# Altium footprint library General.PCBLIB: 231 footprints (part 4 of 15)
Each footprint in its own frame and in the unit in brackets; x right, y up, seen from the top. Pads: shape width x height; smd on the part's side, far side on the other; paste and mask are expansions set on the pad; w line width, h text height; cw(c..) or ccw(c..) is an arc to the next point about the centre after c.
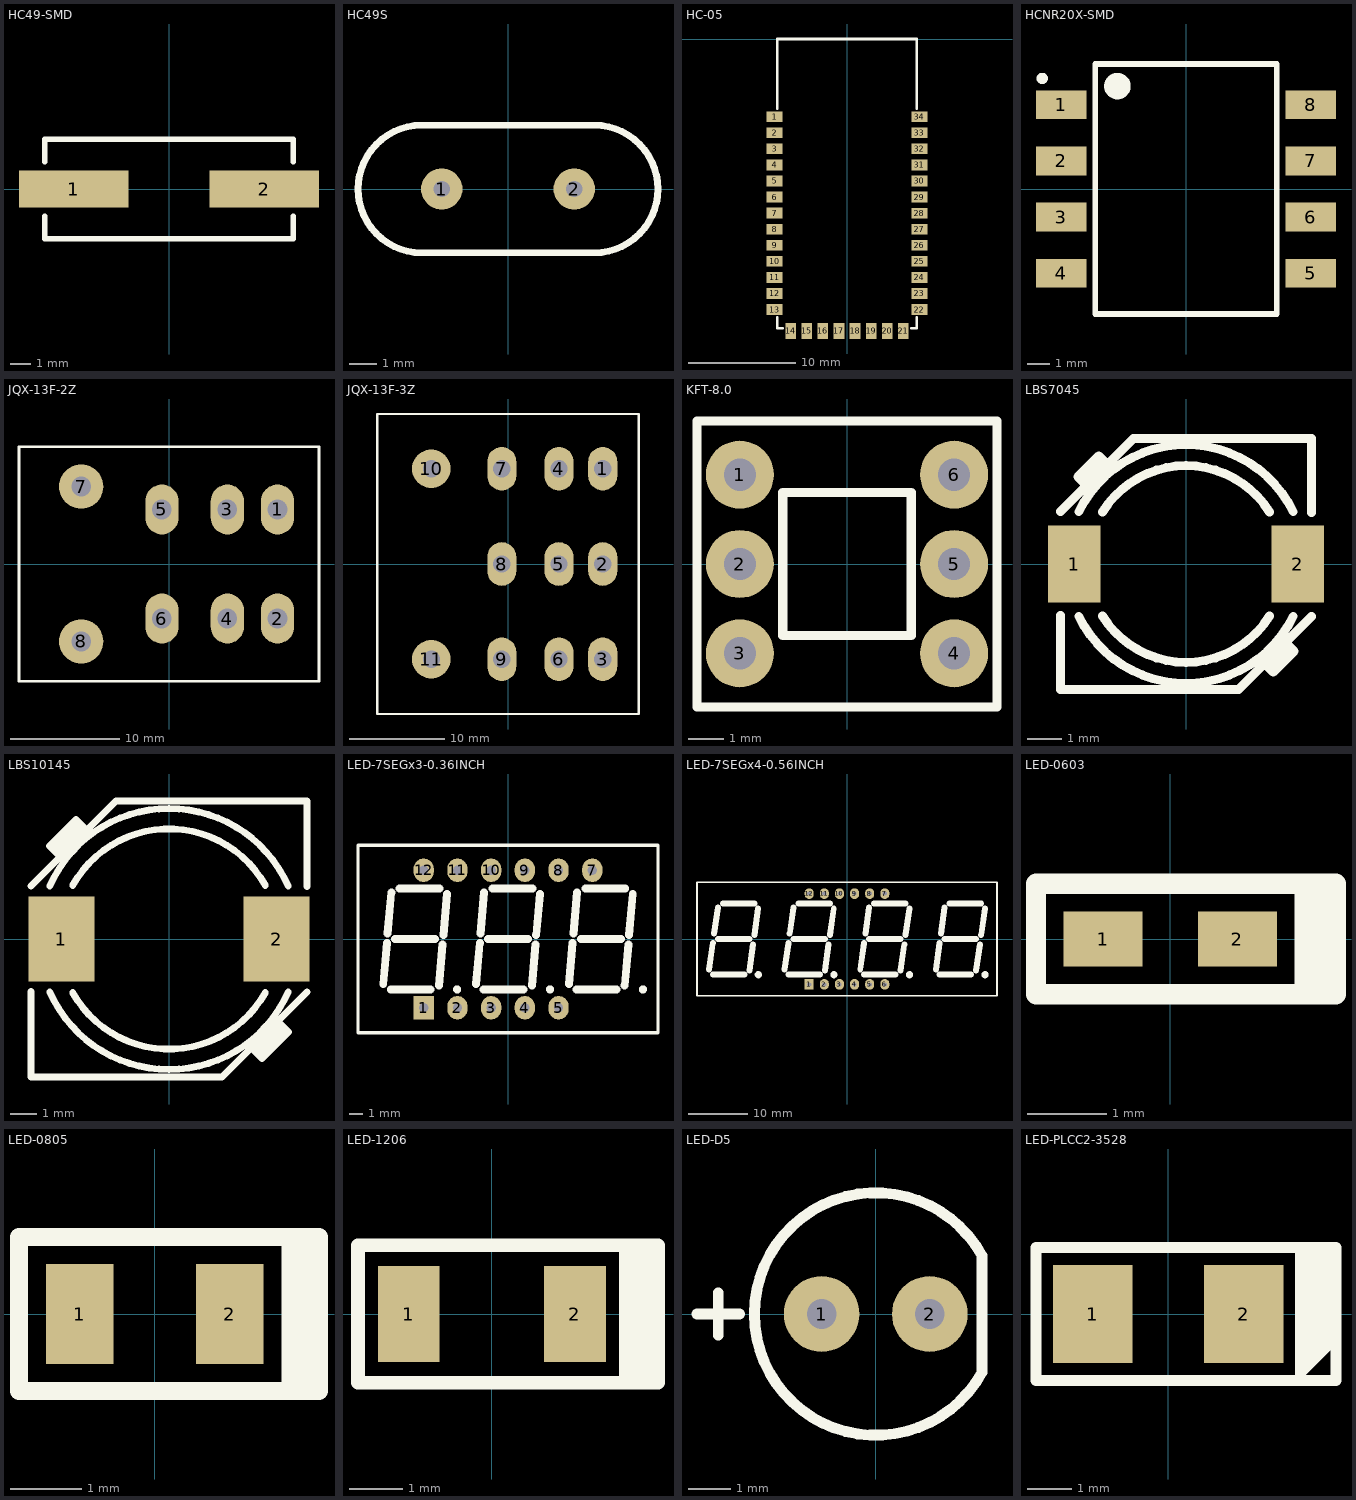
[diagram p3: the footprints below, top view; thin cyan lines are the x and y axes]

## HC49-SMD [mm] "CRYSTAL, SMD"
height 5.08
pads (2):
  rect 5.3x1.8 smd: 1(-4.6,0) 2(4.6,0)
Top Overlay:
  lines w0.254: -6,-1.3 -6,-2.4 6,-2.4 6,-1.3 ; -6,1.3 -6,2.4 6,2.4 6,1.3
3D body "HC49US.STEP": height 4.2, standoff 0, extent -6.35,-2.35 6.35,2.35

## HC49S [mm] "CRYSTAL"
height 4.2
pads (2):
  round 1.524 hole 0.6: 1(-2.44,0) 2(2.44,0)
Top Overlay:
  lines w0.254: -3.175,-2.35 cw(c-3.175,0) -3.175,2.35 3.175,2.35 cw(c3.175,0) 3.175,-2.35 -3.175,-2.35
3D body "HC49S.STEP": height 3.6, standoff -3, extent -5.49,-2.245 5.49,2.246

## HC-05 [mm] "Bluetooth Module, HC-05"
height 2
pads (34):
  rect 1.5x1 smd: 1(-6.75,-7.25) 2(-6.75,-8.75) 3(-6.75,-10.25) 4(-6.75,-11.75) 5(-6.75,-13.25) 6(-6.75,-14.75) 7(-6.75,-16.25) 8(-6.75,-17.75) 9(-6.75,-19.25) 10(-6.75,-20.75) 11(-6.75,-22.25) 12(-6.75,-23.75) 13(-6.75,-25.25) 22(6.75,-25.25) 23(6.75,-23.75) 24(6.75,-22.25) 25(6.75,-20.75) 26(6.75,-19.25) 27(6.75,-17.75) 28(6.75,-16.25) 29(6.75,-14.75) 30(6.75,-13.25) 31(6.75,-11.75) 32(6.75,-10.25) 33(6.75,-8.75) 34(6.75,-7.25)
  rect 1x1.5 smd: 14(-5.25,-27.25) 15(-3.75,-27.25) 16(-2.25,-27.25) 17(-0.75,-27.25) 18(0.75,-27.25) 19(2.25,-27.25) 20(3.75,-27.25) 21(5.25,-27.25)
Top Overlay:
  lines w0.254: -6.5,-26 -6.5,-27 -6,-27 ; -6.5,-6.5 -6.5,0 6.5,0 6.5,-6.5 ; 6,-27 6.5,-27 6.5,-26
3D body: height 2, standoff 0, extent -6.5,-27 6.5,0

## HCNR20X-SMD [mm] "HCNR20X 8 PIN Gull Wing Surface Mount Option #300"
height 5
pads (8):
  rect 2.29x1.3 smd: 1(-5.635,3.81) 2(-5.635,1.27) 3(-5.635,-1.27) 4(-5.635,-3.81) 5(5.635,-3.81) 6(5.635,-1.27) 7(5.635,1.27) 8(5.635,3.81)
Top Overlay:
  circle w0.254: c-6.5,5 r0.127
  circle w0.6: c-3.1,4.65 r0.3
  lines w0.254: -4.1,-5.65 4.1,-5.65 4.1,5.65 -4.1,5.65 -4.1,-5.65
3D body "HCNR200-SMD.STEP": height 4.75, standoff 0, extent -6.15,-5.575 6.15,5.575

## JQX-13F-2Z [mm] "Relay"
height 35
pads (8):
  oval 3.048x4.572 hole 1.8: 1(9.95,5) 2(9.95,-5) 3(5.35,5) 4(5.35,-5) 5(-0.65,5) 6(-0.65,-5)
  round 4.064 hole 1.8: 7(-8.05,7.1) 8(-8.05,-7.1)
Top Overlay:
  lines w0.254: -13.75,-10.75 -13.75,10.75 13.75,10.75 13.75,-10.75 -13.75,-10.75
3D body "LY2.STEP": height 35.3, standoff -6.4, extent -14,-10.75 14,10.75

## JQX-13F-3Z [mm] "Relay"
height 35
pads (11):
  oval 3.048x4.572 hole 1.8: 1(9.95,10) 2(9.95,0) 3(9.95,-10) 4(5.35,10) 5(5.35,0) 6(5.35,-10) 7(-0.65,10) 8(-0.65,0) 9(-0.65,-10)
  round 4.064 hole 1.8: 10(-8.05,10) 11(-8.05,-10)
Top Overlay:
  lines w0.254: -13.75,-15.75 13.75,-15.75 13.75,15.75 -13.75,15.75 -13.75,-15.75
3D body: height 35, standoff 0, extent -13.75,-15.75 13.75,15.75

## KFT-8.0 [mm] "PUSH SWITCH"
height 13
pads (6):
  round 1.905 hole 0.9: 1(-3,2.5) 2(-3,0) 3(-3,-2.5) 4(3,-2.5) 5(3,0) 6(3,2.5)
Top Overlay:
  lines w0.254: -4.2,-4 -4.2,4 4.2,4 4.2,-4 -4.2,-4 ; -1.8,-2 -1.8,2 1.8,2 1.8,-2 -1.8,-2
3D body "KFT-8.0.STEP": height 13.5, standoff -3.5, extent -4,-4.2 4,4

## LBS7045 [mm] "FENGHUA, Inductor, SMD, LBS7045"
height 4.5
pads (2):
  rect 1.5x2.2 smd: 1(-3.2,0) 2(3.2,0)
Top Overlay:
  lines w0.254: -3.6,-1.48 -3.6,-3.6 1.5,-3.6 3.6,-1.5 ; -3.6,1.5 -1.5,3.6 3.6,3.6 3.6,1.48 ; -3.074,-1.499 ccw(c0,0) 3.074,-1.499 ; -3.074,1.499 cw(c0,0) 3.074,1.499 ; -3,2.4 -2.4,3 ; -2.8,2.2 -3.1,2.5 -2.5,3.1 -2.2,2.8 ; -2.391,-1.494 ccw(c0,0) 2.391,-1.494 ; -2.391,1.494 cw(c0,0) 2.391,1.494 ; 2.2,-2.8 2.5,-3.1 3.1,-2.5 2.8,-2.2 ; 2.4,-3 3,-2.4
3D body "SUMIDA-CDRR75.STEP": height 4.5, standoff -0.03, extent -3.525,-3.5 3.525,3.5

## LBS10145 [mm] "FENGHUA, Inductor, SMD, LBS10145"
height 4.5
pads (2):
  rect 2.5x3.2 smd: 1(-4.05,0) 2(4.05,0)
Top Overlay:
  lines w0.254: -5.2,-1.98 -5.2,-5.2 2,-5.2 5.2,-2 ; -5.2,2 -2,5.2 5.2,5.2 5.2,1.98 ; -4.49,-1.999 ccw(c0,0) 4.49,-1.999 ; -4.49,1.999 cw(c0,0) 4.49,1.999 ; -4.4,3.4 -3.4,4.4 ; -4.3,3.3 -3.3,4.3 ; -4.2,3.2 -3.2,4.2 ; -4,3 -4.5,3.5 -3.5,4.5 -3,4 ; -3.63,-2.012 ccw(c0,0) 3.63,-2.012 ; -3.63,2.012 cw(c0,0) 3.63,2.012 ; 3,-4 3.5,-4.5 4.5,-3.5 4,-3 ; 3.2,-4.2 4.2,-3.2 ; 3.3,-4.3 4.3,-3.3 ; 3.4,-4.4 4.4,-3.4
3D body "SUMIDA-CDRR105.STEP": height 4.5, standoff -0.03, extent -5.025,-5 5.025,5

## LED-7SEGx3-0.36INCH [mm] "LED Digitals Display, 0.36 inch, 3 Digitals"
height 7.2
pads (11):
  rect 1.524x1.778 hole 0.7: 1(-6.35,-5.18)
  oval 1.524x1.778 hole 0.7: 2(-3.81,-5.18) 3(-1.27,-5.18) 4(1.27,-5.18) 5(3.81,-5.18) 7(6.35,5.18) 8(3.81,5.18) 9(1.27,5.18) 10(-1.27,5.18) 11(-3.81,5.18) 12(-6.35,5.18)
Top Overlay:
  circle w0.4: c3.167,-3.8 r0.1
  circle w0.4: c-3.833,-3.8 r0.1
  circle w0.4: c10.168,-3.8 r0.1
  lines w0.254: -11.3,-7.05 -11.3,7.05 11.3,7.05 11.3,-7.05 -11.3,-7.05
  lines w0.6: -9.398,-3.4 -9.126,-0.296 ; -9.065,0.4 -8.793,3.504 ; -8.833,-3.8 -5.833,-3.8 ; -8.5,0 -5.5,0 ; -8.168,3.8 -5.168,3.8 ; -5.207,-3.504 -4.935,-0.4 ; -4.874,0.296 -4.603,3.4 ; -2.398,-3.4 -2.126,-0.296 ; -2.065,0.4 -1.793,3.504 ; -1.833,-3.8 1.168,-3.8 ; -1.5,0 1.5,0 ; -1.168,3.8 1.833,3.8 ; 1.793,-3.504 2.065,-0.4 ; 2.126,0.296 2.398,3.4 ; 4.603,-3.4 4.874,-0.296 ; 4.935,0.4 5.207,3.504 ; 5.168,-3.8 8.168,-3.8 ; 5.5,0 8.5,0 ; 5.833,3.8 8.833,3.8 ; 8.793,-3.504 9.065,-0.4 ; 9.126,0.296 9.398,3.4
3D body "LED-7SEGx3-0.36INCH.STEP": height 7.2, standoff -3.05, extent -11.3,-7.05 11.3,7.05

## LED-7SEGx4-0.56INCH [mil] "LED Digitals Display, 0.56 inch, 4 Digitals"
height 314.96
pads (12):
  rect 60x70 hole 27.56: 1(-250,-300)
  oval 60x70 hole 27.56: 2(-150,-300) 3(-50,-300) 4(50,-300) 5(150,-300) 6(250,-300) 7(250,300) 8(150,300) 9(50,300) 10(-50,300) 11(-150,300) 12(-250,300)
Top Overlay:
  circle w31.5: c-586.61,-236.22 r7.87
  circle w31.5: c913.39,-236.22 r7.87
  circle w31.5: c413.39,-236.22 r7.87
  circle w31.5: c-86.61,-236.22 r7.87
  lines w10: -992.13,-374.02 -992.13,374.02 992.13,374.02 992.13,-374.02 -992.13,-374.02
  lines w39.37: -912.35,-201.14 -887.72,-27.29 ; -887.8,-236.22 -679.13,-236.22 ; -878.89,35.08 -854.26,208.93 ; -854.33,0 -645.67,0 ; -820.87,236.22 -612.2,236.22 ; -645.74,-208.93 -621.11,-35.08 ; -612.28,27.29 -587.65,201.14 ; -412.35,-201.14 -387.72,-27.29 ; -387.8,-236.22 -179.13,-236.22 ; -378.89,35.08 -354.26,208.93 ; -354.33,0 -145.67,0 ; -320.87,236.22 -112.2,236.22 ; -145.74,-208.93 -121.11,-35.08 ; -112.28,27.29 -87.65,201.14 ; 87.65,-201.14 112.28,-27.29 ; 112.2,-236.22 320.87,-236.22 ; 121.11,35.08 145.74,208.93 ; 145.67,0 354.33,0 ; 179.13,236.22 387.8,236.22 ; 354.26,-208.93 378.89,-35.08 ; 387.72,27.29 412.35,201.14 ; 587.65,-201.14 612.28,-27.29 ; 612.2,-236.22 820.87,-236.22 ; 621.11,35.08 645.74,208.93 ; 645.67,0 854.33,0 ; 679.13,236.22 887.8,236.22 ; 854.26,-208.93 878.89,-35.08 ; 887.72,27.29 912.35,201.14
3D body "LED-7SEGx4-0.56INCH.STEP": height 314.96, standoff -137.8, extent -990.16,-374.02 990.16,374.02

## LED-0603 [mm] "LED, SMD, 0603"
height 0.8
pads (2):
  rect 1x0.7 smd: 1(-0.85,0) 2(0.85,0)
Top Overlay:
  lines w0.254: 1.7,-0.7 1.7,0.7 ; 1.9,-0.7 1.9,0.7 ; -1.7,-0.7 -1.7,0.7 2.1,0.7 2.1,-0.7 -1.7,-0.7
3D body "LED-0805.STEP": height 0.85, standoff 0.01, extent -1.03,-0.455 1.032,0.451

## LED-0805 [mm] "LED, SMD, 0805"
height 0.8
pads (2):
  rect 0.95x1.4 smd: 1(-1.05,0) 2(1.05,0)
Top Overlay:
  lines w0.254: 1.9,-1.08 1.9,1.08 ; 2.1,-1.08 2.1,1.08 ; -1.9,-1.08 -1.9,1.08 2.3,1.08 2.3,-1.08 -1.9,-1.08
3D body "LED-0805.STEP": height 0.85, standoff 0.01, extent -1.03,-0.455 1.032,0.451

## LED-1206 [mm] "LED, SMD, 1206"
height 0.8
pads (2):
  rect 1.15x1.8 smd: 1(-1.55,0) 2(1.55,0)
Top Overlay:
  lines w0.254: 2.5,-1.28 2.5,1.28 ; 2.7,-1.28 2.7,1.28 ; 2.9,-1.28 2.9,1.28 ; -2.5,-1.28 3.1,-1.28 3.1,1.28 -2.5,1.28 -2.5,-1.28
3D body "LED-1206.STEP": height 1.1, standoff 0, extent -1.6,-0.8 1.6,0.8

## LED-D5 [mil] "LED"
height 425.2
pads (2):
  round 70 hole 27.56: 1(-50,0) 2(50,0)
Top Overlay:
  lines w10: -165.35,0 -125.98,0 ; -145.67,-19.68 -145.67,19.68 ; 98.42,-53.87 cw(c0,0) 98.42,53.87 ; 98.43,-53.87 98.43,53.87
3D body "LED-D5-White.STEP": height 484.75, standoff -97.93, extent -108.27,-118.11 105.12,118.88

## LED-PLCC2-3528 [mm] "LED, SMD, PLCC2 3528"
height 1.9
pads (2):
  rect 1.8x2.2 smd: 1(-1.7,0) 2(1.7,0)
Top Overlay:
  lines w0.254: 2.98,-1.5 2.98,1.5 ; 2.98,-1.32 3.78,-0.52 ; 3.18,-1.07 3.18,1.5 ; 3.4,-0.82 3.4,1.5 ; 3.58,-0.67 3.58,1.5 ; -2.98,-1.5 -2.98,1.5 3.78,1.5 3.78,-1.5 -2.98,-1.5
3D body "LED-PLCC2_3528.STEP": height 1.86, standoff 0, extent -1.75,-1.4 1.75,1.4